# Altium footprint library KwantLib.PcbLib: 249 footprints (part 14 of 16)
Each footprint in its own frame and in the unit in brackets; x right, y up, seen from the top. Pads: shape width x height; smd on the part's side, far side on the other; paste and mask are expansions set on the pad; w line width, h text height; cw(c..) or ccw(c..) is an arc to the next point about the centre after c.
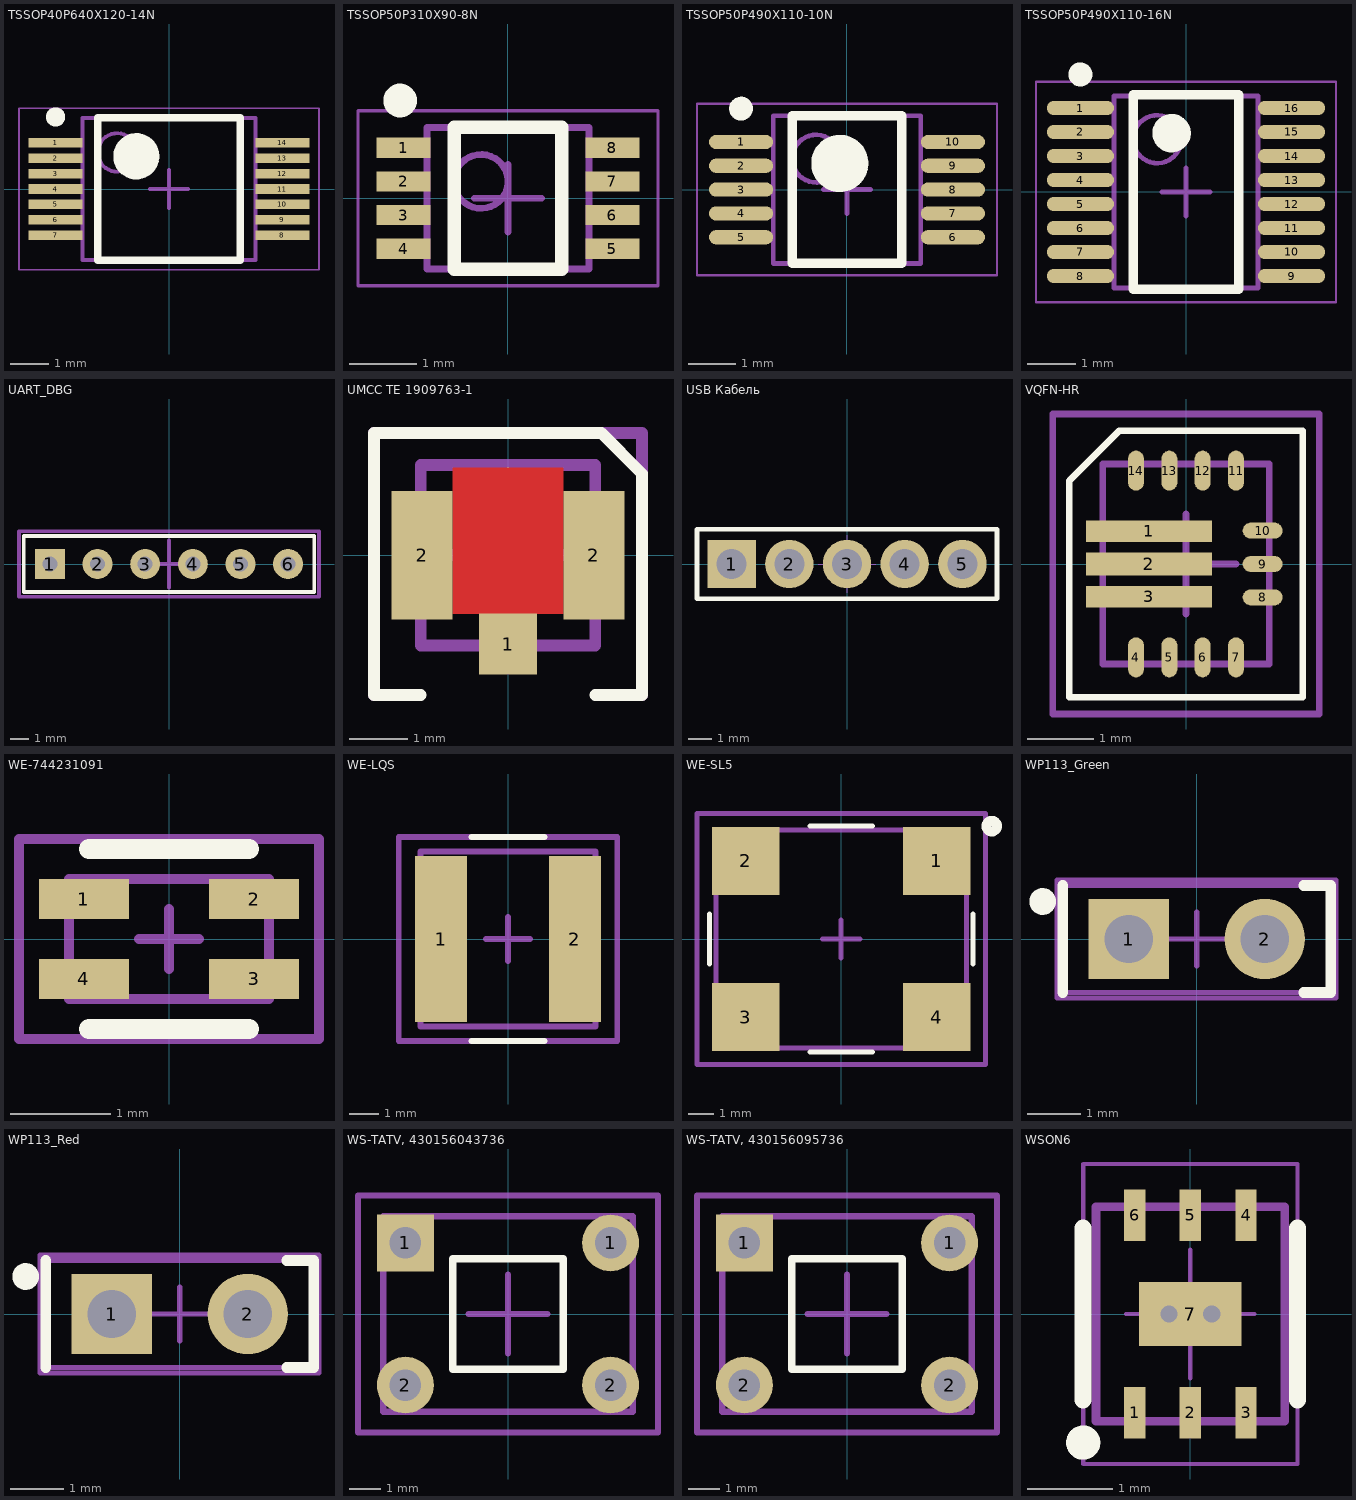
[diagram p13: the footprints below, top view; thin cyan lines are the x and y axes]

## TSSOP40P640X120-14N [mm] "TSSOP, 14-Leads, Body 3.60x4.40mm, Pitch 0.40mm, IPC Medium Density"
height 1.2
pads (14):
  rect 1.4x0.25 smd mask+0.07: 1(-2.95,1.2) 2(-2.95,0.8) 3(-2.95,0.4) 4(-2.95,0) 5(-2.95,-0.4) 6(-2.95,-0.8) 7(-2.95,-1.2) 8(2.95,-1.2) 9(2.95,-0.8) 10(2.95,-0.4) 11(2.95,0) 12(2.95,0.4) 13(2.95,0.8) 14(2.95,1.2)
Top Overlay:
  circle w0.6: c-0.85,0.85 r0.3
  circle w0.25: c-2.95,1.875 r0.125
  lines w0.2: -1.85,-1.85 1.85,-1.85 1.85,1.85 -1.85,1.85 -1.85,-1.85
Mechanical 13:
  circle w0.1: c-1.35,0.95 r0.5
  lines w0.1: -2.25,-1.85 2.25,-1.85 2.25,1.85 -2.25,1.85 -2.25,-1.85
Mechanical 15:
  lines w0.05: -3.9,-2.1 3.9,-2.1 3.9,2.1 -3.9,2.1 -3.9,-2.1
  lines w0.1: -0.5,0 0.5,0 ; 0,-0.5 0,0.5
3D body "TSSOP40P640X120-14N.step": height 1.2, standoff 0, extent -3.2,-1.85 3.2,1.85

## TSSOP50P310X90-8N [mm] "TSSOP, 8-Leads, Body 2.00x2.30mm, Pitch 0.50mm, IPC Medium Density"
height 0.9
pads (8):
  rect 0.8x0.3 smd paste-0.025 mask+0.07: 1(-1.55,0.75) 2(-1.55,0.25) 3(-1.55,-0.25) 4(-1.55,-0.75) 5(1.55,-0.75) 6(1.55,-0.25) 7(1.55,0.25) 8(1.55,0.75)
Top Overlay:
  circle w0.25: c-1.6,1.45 r0.125
  lines w0.2: -0.8,-1.05 0.8,-1.05 0.8,1.05 -0.8,1.05 -0.8,-1.05
Mechanical 13:
  circle w0.1: c-0.4,0.25 r0.4
  lines w0.1: -1.2,-1.05 1.2,-1.05 1.2,1.05 -1.2,1.05 -1.2,-1.05
Mechanical 15:
  lines w0.05: -2.225,-1.3 2.225,-1.3 2.225,1.3 -2.225,1.3 -2.225,-1.3
  lines w0.1: -0.5,0 0.5,0 ; 0,-0.5 0,0.5
3D body "TSSOP50P310X90-8N.step": height 0.9, standoff 0, extent -1.549,-1.05 1.549,1.05

## TSSOP50P490X110-10N [mm] "TSSOP, 10-Leads, Body 3.00x3.00mm, Pitch 0.50mm, IPC Medium Density"
height 1.1
pads (10):
  oval 1.35x0.3 smd paste-0.03 mask+0.07: 1(-2.225,1) 2(-2.225,0.5) 3(-2.225,0) 4(-2.225,-0.5) 5(-2.225,-1) 6(2.225,-1) 7(2.225,-0.5) 8(2.225,0) 9(2.225,0.5) 10(2.225,1)
Top Overlay:
  circle w0.6: c-0.15,0.55 r0.3
  circle w0.25: c-2.225,1.7 r0.125
  lines w0.2: -1.15,-1.55 1.15,-1.55 1.15,1.55 -1.15,1.55 -1.15,-1.55
Mechanical 13:
  circle w0.1: c-0.65,0.65 r0.5
  lines w0.1: -1.55,-1.55 1.55,-1.55 1.55,1.55 -1.55,1.55 -1.55,-1.55
Mechanical 15:
  lines w0.05: -3.15,-1.8 3.15,-1.8 3.15,1.8 -3.15,1.8 -3.15,-1.8
  lines w0.1: -0.5,0 0.5,0 ; 0,-0.5 0,0.5
3D body "TSSOP50P490X110-10N.step": height 1.1, standoff 0, extent -2.45,-1.55 2.45,1.55

## TSSOP50P490X110-16N [mm] "TSSOP, 16-Leads, Body 4.04x3.00mm, Pitch 0.50mm, IPC Medium Density"
height 1.1
pads (16):
  oval 1.4x0.3 smd mask+0.075: 1(-2.2,1.75) 2(-2.2,1.25) 3(-2.2,0.75) 4(-2.2,0.25) 5(-2.2,-0.25) 6(-2.2,-0.75) 7(-2.2,-1.25) 8(-2.2,-1.75) 9(2.2,-1.75) 10(2.2,-1.25) 11(2.2,-0.75) 12(2.2,-0.25) 13(2.2,0.25) 14(2.2,0.75) 15(2.2,1.25) 16(2.2,1.75)
Top Overlay:
  circle w0.25: c-2.2,2.45 r0.125
  circle w0.4: c-0.3,1.225 r0.2
  lines w0.2: -1.1,-2.025 -1.1,2.025 1.1,2.025 1.1,-2.025 -1.1,-2.025
Mechanical 13:
  circle w0.1: c-0.6,1.1 r0.5
  lines w0.1: -1.5,-2 -1.5,2 1.5,2 1.5,-2 -1.5,-2
Mechanical 15:
  lines w0.05: -3.125,-2.3 -3.125,2.3 3.125,2.3 3.125,-2.3 -3.125,-2.3
  lines w0.1: -0.5,0 0.5,0 ; 0,-0.5 0,0.5
3D body "TSSOP50P490X110-16N.step": height 1.1, standoff 0, extent -2.45,-2 2.45,2

## UART_DBG [mm]
pads (6):
  rect 1.6x1.6 hole 0.8: 1(-6.35,0)
  round 1.6 hole 0.8: 2(-3.81,0) 3(-1.27,0) 4(1.27,0) 5(3.81,0) 6(6.35,0)
Top Overlay:
  lines w0.2: -7.75,-1.5 7.75,-1.5 7.75,1.5 -7.75,1.5 -7.75,-1.5
Mechanical 15:
  lines w0.2: -1.27,0 1.27,0 ; 0,-1.27 0,1.27 ; -8,-1.75 -8,1.75 8,1.75 8,-1.75 -8,-1.75

## UMCC TE 1909763-1 [mm]
height 1.25
pads (3):
  rect 1x1.05 smd mask+0.07: 1(0,-1.525)
  rect 1.05x2.2 smd mask+0.07: 2(-1.475,0) 2(1.475,0)
Top Layer:
  pour cut-out: -0.95,-1 -0.95,1.5 0.95,1.5 0.95,-1
Top Overlay:
  lines w0.2: -1.5,-2.4 -2.3,-2.4 -2.3,2.1 1.6,2.1 2.3,1.4 2.3,-2.4 1.5,-2.4
Mechanical 13:
  lines w0.2: -1.5,-1.55 -1.5,1.55 1.5,1.55 1.5,-1.55 -1.5,-1.55
Mechanical 15:
  lines w0.2: -2.3,-2.4 -2.3,2.1 2.3,2.1 2.3,-2.4 ; -1,0 1,0 ; 0,-1 0,1
3D body "С-1909763-1.stp": height 1.23, standoff 0, extent -1.5,-1.55 1.5,1.55

## USB Кабель [mm]
pads (5):
  rect 2.1x2.1 hole 1.3: 1(-5,0)
  round 2.1 hole 1.3: 2(-2.5,0) 3(0,0) 4(2.5,0) 5(5,0)
Top Overlay:
  lines w0.2: -6.5,-1.5 6.5,-1.5 6.5,1.5 -6.5,1.5 -6.5,-1.5
Mechanical 13:
  circle w0.1: c0,0 r0.785
  circle w0.1: c-2.5,0 r0.785
  circle w0.1: c-5,0 r0.785
  circle w0.1: c2.5,0 r0.785
  circle w0.1: c5,0 r0.785
Mechanical 15:
  lines w0.05: -1.25,0 1.25,0 ; 0,-1.25 0,1.25 ; -6.5,-1.5 -6.5,1.5 6.5,1.5 6.5,-1.5 -6.5,-1.5
3D body "1528-2.stp": height 2.37, standoff -2.12, extent -0.785,-0.784 0.785,0.785
3D body "1528-2.stp": height 2.37, standoff -2.12, extent -3.285,-0.784 -1.715,0.785
3D body "1528-2.stp": height 2.37, standoff -2.12, extent -5.785,-0.784 -4.215,0.785
3D body "1528-2.stp": height 2.37, standoff -2.12, extent 1.715,-0.784 3.285,0.785
3D body "1528-2.stp": height 2.37, standoff -2.12, extent 4.215,-0.784 5.785,0.785

## VQFN-HR [mm]
pads (14):
  rect 1.89x0.32 smd paste-5 mask-0.05: 1(-0.555,0.49)
  rect 1.89x0.34 smd paste-1 mask-0.05: 2(-0.555,0)
  rect 1.89x0.32 smd paste-1 mask-0.05: 3(-0.555,-0.49)
  oval 0.24x0.6 smd paste-1 mask+0.05: 4(-0.75,-1.4) 5(-0.25,-1.4) 6(0.25,-1.4) 7(0.75,-1.4) 11(0.75,1.4) 12(0.25,1.4) 13(-0.25,1.4) 14(-0.75,1.4)
  oval 0.6x0.24 smd paste-1 mask+0.05: 8(1.15,-0.5) 9(1.15,0) 10(1.15,0.5)
Top Overlay:
  lines w0.1: -1.75,-2 -1.75,1.25 -1,2 1.75,2 1.75,0.25 1.75,-2 -1.75,-2
Top Paste:
  drawing of 61 lines, arcs and shapes, not listed
Mechanical 13:
  lines w0.1: -1.25,-1.5 -1.25,1.5 1.25,1.5 1.25,-1.5 -1.25,-1.5
Mechanical 15:
  lines w0.1: -0.75,0 0.75,0 ; 0,-0.75 0,0.75 ; -2,-2.25 -2,2.25 2,2.25 2,-2.25 -2,-2.25
3D body: height 1, standoff 0.01, extent -1.25,-1.5 1.25,1.5

## WE-744231091 [mm] "Wurth Common mode filter, 0805"
height 1.2
pads (4):
  rect 0.9x0.4 smd paste-0.03 mask+0.07: 1(-0.85,0.4) 2(0.85,0.4) 3(0.85,-0.4) 4(-0.85,-0.4)
Top Overlay:
  lines w0.2: -0.8,-0.9 0.8,-0.9 ; -0.8,0.9 0.8,0.9
Mechanical 13:
  lines w0.1: -1,-0.6 -1,0.6 1,0.6 1,-0.6 -1,-0.6
Mechanical 15:
  lines w0.1: -0.3,0 0.3,0 ; 0,-0.3 0,0.3 ; -1.5,-1 -1.5,1 1.5,1 1.5,-1 -1.5,-1
3D body: height 1.2, standoff 0, extent -1,-0.6 1,0.6

## WE-LQS [mm] "WE-LQS SMD Power Inductor"
height 4.5
pads (2):
  rect 1.8x5.7 smd: 1(-2.3,0) 2(2.3,0)
Top Overlay:
  lines w0.2: -1.25,-3.5 1.25,-3.5 ; -1.25,3.5 1.25,3.5
Mechanical 13:
  lines w0.2: -3,-3 3,-3 3,3 -3,3 -3,-3
Mechanical 15:
  lines w0.2: -0.75,0 0.75,0 ; 0,-0.75 0,0.75 ; -3.75,-3.5 -3.75,3.5 3.75,3.5 3.75,-3.5 -3.75,-3.5
3D body "STEP-WE-LQS-6045-rev1.stp": height 4.5, standoff 0, extent -3,-3 3,3

## WE-SL5 [mm] "WE-SL5 SMD Common Mode Line Filter"
height 6.5
pads (4):
  rect 2.7x2.7 smd: 1(3.81,3.11) 2(-3.81,3.11) 3(-3.81,-3.11) 4(3.81,-3.11)
Top Overlay:
  circle w0.4: c6,4.5 r0.21
  lines w0.2: -5.25,-1 -5.25,1 ; -1.25,-4.5 1.25,-4.5 ; -1.25,4.5 1.25,4.5 ; 5.25,-1 5.25,1
Mechanical 13:
  lines w0.2: -5,-4.35 5,-4.35 5,4.35 -5,4.35 -5,-4.35
Mechanical 15:
  lines w0.2: -0.75,0 0.75,0 ; 0,-0.75 0,0.75 ; -5.75,-5 -5.75,5 5.75,5 5.75,-5 -5.75,-5
3D body "STEP-744272471-rev1.stp": height 6, standoff 0, extent -5,-4.35 5,4.35

## WP113_Green [mm] "Прямоугольный светодиод"
height 7
pads (2):
  rect 1.5x1.5 hole 0.9: 1(-1.27,0)
  round 1.5 hole 0.9: 2(1.27,0)
Top Overlay:
  circle w0.25: c-2.875,0.7 r0.125
  lines w0.2: -2.5,-1 -2.5,-1 -2.5,1 -2.5,1 ; 2,-1 2.5,-1 2.5,1 2,1
Mechanical 13:
  lines w0.1: -2.5,-1 2.5,-1 2.5,1 -2.5,1 -2.5,-1
Mechanical 15:
  lines w0.1: -0.5,0 0.5,0 ; 0,-0.5 0,0.5 ; -2.6,-1.1 2.6,-1.1 2.6,1.1 -2.6,1.1 -2.6,-1.1
3D body "WP113_Green.stp": height 12, standoff -2, extent -2.5,-1 2.5,1

## WP113_Red [mm] "Прямоугольный светодиод"
height 7
pads (2):
  rect 1.5x1.5 hole 0.9: 1(-1.27,0)
  round 1.5 hole 0.9: 2(1.27,0)
Top Overlay:
  circle w0.25: c-2.875,0.7 r0.125
  lines w0.2: -2.5,-1 -2.5,-1 -2.5,1 -2.5,1 ; 2,-1 2.5,-1 2.5,1 2,1
Mechanical 13:
  lines w0.1: -2.5,-1 -2.5,1 2.5,1 2.5,-1 -2.5,-1
Mechanical 15:
  lines w0.1: -0.5,0 0.5,0 ; 0,-0.5 0,0.5 ; -2.6,-1.1 -2.6,1.1 2.6,1.1 2.6,-1.1 -2.6,-1.1
3D body "WP113_Red.stp": height 12, standoff -2, extent -2.5,-1 2.5,1

## WS-TATV, 430156043736 [mm] "6*6mm vertical type, THT, height 4.3mm, white actuator, 360gf, Bulk"
height 4.3
pads (4):
  rect 1.8x1.8 hole 1: 1(-3.25,2.25)
  round 1.8 hole 1: 1(3.25,2.25) 2(-3.25,-2.25) 2(3.25,-2.25)
Top Overlay:
  lines w0.25: -1.75,-1.75 1.75,-1.75 1.75,1.75 -1.75,1.75 -1.75,-1.75
Mechanical 13:
  lines w0.2: -3.947,-3.1 3.947,-3.1 3.947,3.1 -3.947,3.1 -3.947,-3.1
Mechanical 15:
  lines w0.2: -1.25,0 1.25,0 ; 0,-1.25 0,1.25 ; -4.75,-3.75 -4.75,3.75 4.75,3.75 4.75,-3.75 -4.75,-3.75
3D body "4301x60437x6.stp": height 4.31, standoff -3.49, extent -3.947,-3.1 3.947,3.1

## WS-TATV, 430156095736 [mm] "6*6mm vertical type, THT, height 9.5mm, white actuator, 360gf, Bulk"
height 9.5
pads (4):
  rect 1.8x1.8 hole 1: 1(-3.25,2.25)
  round 1.8 hole 1: 1(3.25,2.25) 2(-3.25,-2.25) 2(3.25,-2.25)
Top Overlay:
  lines w0.25: -1.75,-1.75 1.75,-1.75 1.75,1.75 -1.75,1.75 -1.75,-1.75
Mechanical 13:
  lines w0.2: -3.947,-3.1 3.947,-3.1 3.947,3.1 -3.947,3.1 -3.947,-3.1
Mechanical 15:
  lines w0.2: -1.25,0 1.25,0 ; 0,-1.25 0,1.25 ; -4.75,-3.75 -4.75,3.75 4.75,3.75 4.75,-3.75 -4.75,-3.75
3D body "4301x60957x6.stp": height 9.51, standoff -3.49, extent -3.947,-3.1 3.947,3.1

## WSON6 [mm]
height 0.8
pads (7):
  rect 0.25x0.6 smd paste-0.02 mask+0.07: 1(-0.65,-1.15) 2(0,-1.15) 3(0.65,-1.15) 4(0.65,1.15) 5(0,1.15) 6(-0.65,1.15)
  rect 1.2x0.75 smd paste-0.03 mask+0.07: 7(0,0)
via -0.25,0 diameter 0.4 hole 0.2
via 0.25,0 diameter 0.4 hole 0.2
Top Overlay:
  circle w0.2: c-1.25,-1.5 r0.1
  lines w0.2: -1.25,-1 -1.25,1 ; 1.25,-1 1.25,1
Mechanical 13:
  lines w0.1: -1.1,-1.25 1.1,-1.25 1.1,1.25 -1.1,1.25 -1.1,-1.25
Mechanical 15:
  lines w0.05: -0.75,0 0.75,0 ; 0,-0.75 0,0.75 ; -1.25,-1.75 -1.25,1.75 1.25,1.75 1.25,-1.75 -1.25,-1.75
3D body "LP5900.stp": height 0.8, standoff 0, extent -1.1,-1.25 1.1,1.25